# Altium footprint library Power_Lib_Altium.PcbLib: 383 footprints (part 21 of 24)
Each footprint in its own frame and in the unit in brackets; x right, y up, seen from the top. Pads: shape width x height; smd on the part's side, far side on the other; paste and mask are expansions set on the pad; w line width, h text height; cw(c..) or ccw(c..) is an arc to the next point about the centre after c.
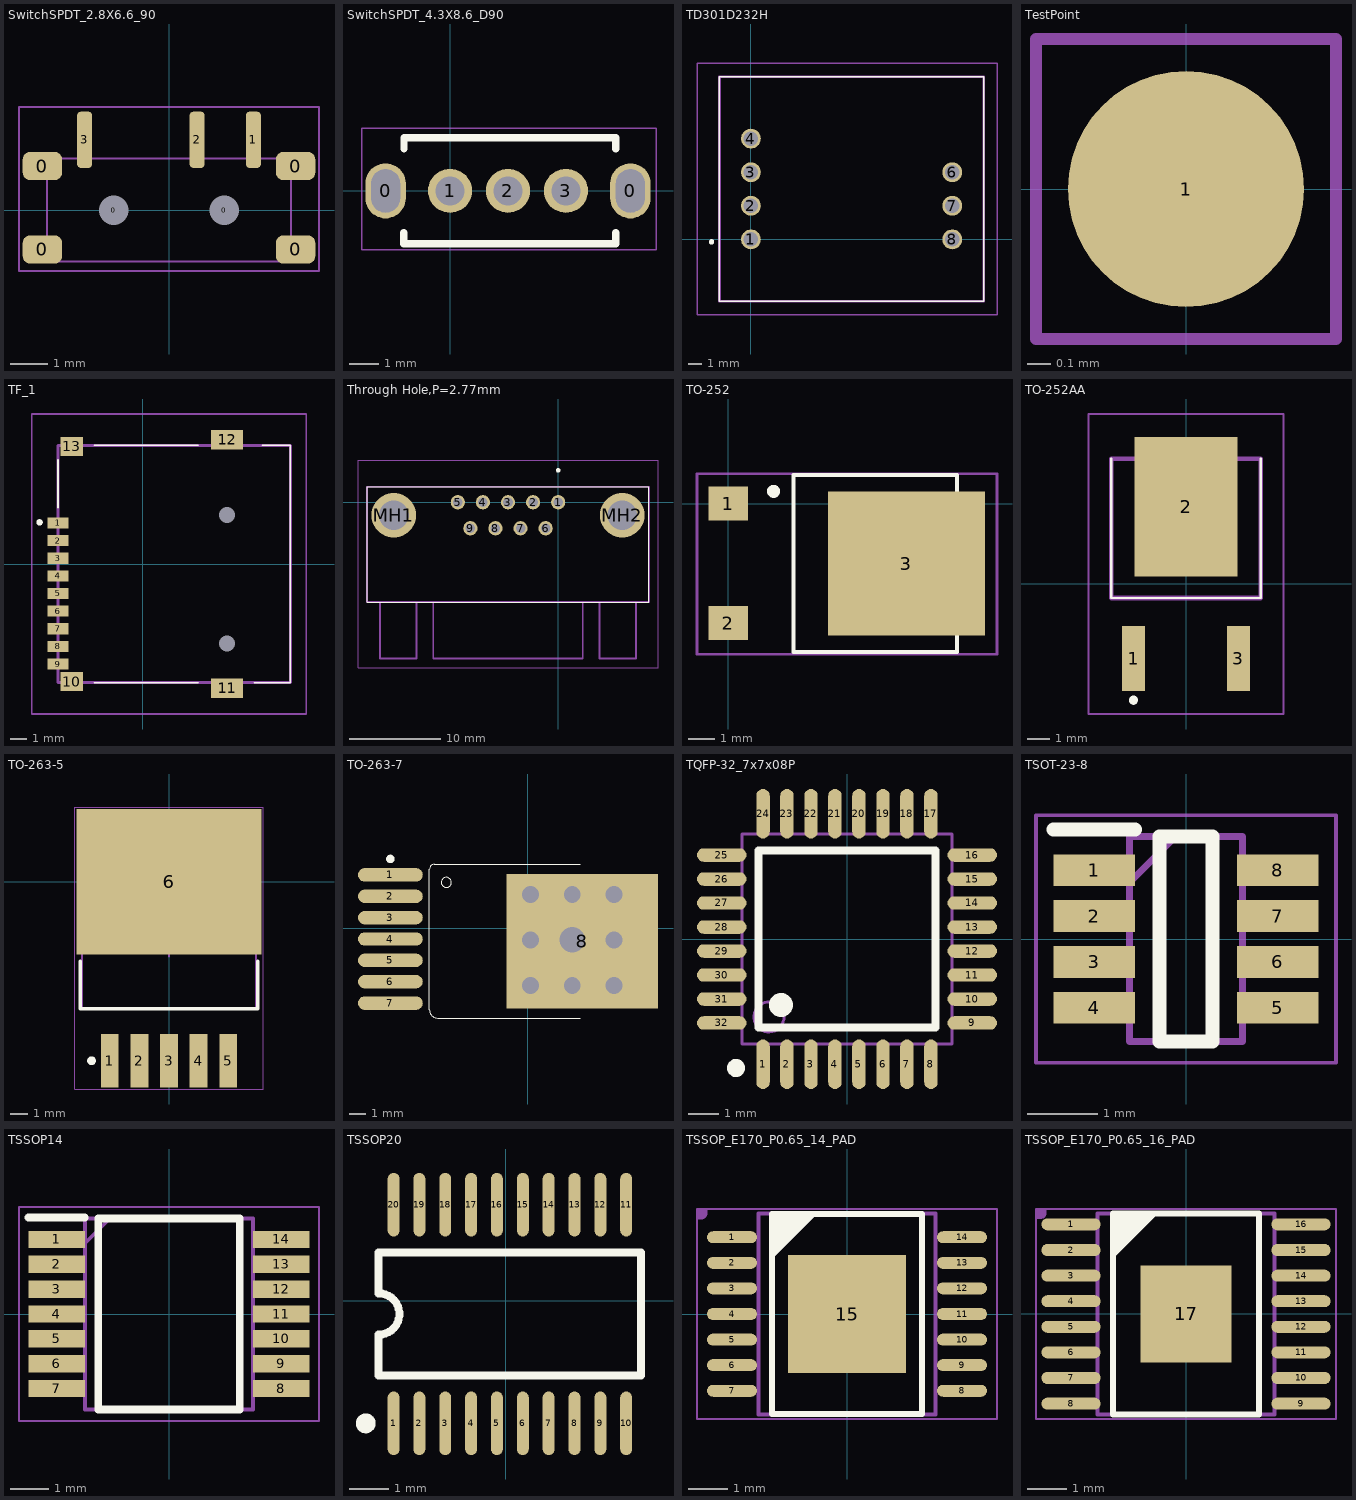
[diagram p20: the footprints below, top view; thin cyan lines are the x and y axes]

## SwitchSPDT_2.8X6.6_90 [mil]
pads (9):
  rrect50% 42x30 smd: 0(-135,-42) 0(-135,47) 0(135,-42) 0(135,47)
  round 10 hole 31.5: 0(-59.06,0) 0(59.06,0)
  rrect50% 16x60 smd: 1(90,75) 2(30,75) 3(-90,75)
Mechanical 13:
  lines w2: -130,-55 130,-55 130,55 -130,55 -130,-55
Mechanical 14:
  lines w2: -160,-65 160,-65 160,110 -160,110 -160,-65
3D body "User Library-MSS3_slide_switch_v2.STEP": height 55.12, standoff -19.68, extent -152.24,-110.67 150.91,86.18

## SwitchSPDT_4.3X8.6_D90 [mil]
pads (5):
  oval 55x75 hole 39.37 slot 59.06 at 90 deg: 0(-87.68,0) 0(245.16,0)
  round 60 hole 39.37: 1(0,0) 2(78.74,0) 3(157.48,0)
Top Overlay:
  lines w10: -62.83,-57 -62.83,-72 225,-72 225,-57 ; -62.68,57 -62.68,72 225.16,72 225.16,57
Mechanical 13:
  lines w2: -120,-80 -120,85 280,85 280,-80 -120,-80
Mechanical 14:
  lines w2: -120,-80 280,-80 280,85 -120,85 -120,-80
3D body "User Library-CK_Slide.STEP": height 190, standoff -105, extent -90.76,-245.62 248.24,84

## TD301D232H [mm]
pads (7):
  round 1.5 hole 1.1: 1(0,0) 2(0,2.54) 3(0,5.08) 4(0,7.62) 6(15.24,5.08) 7(15.24,2.54) 8(15.24,0)
Top Overlay:
  lines w0.1: -2.38,-4.69 -2.38,12.31 17.62,12.31 17.62,-4.69 -2.38,-4.69
  lines w0.2: -3.08,-0.19 ccw(c-2.98,-0.19) -2.88,-0.19 ccw(c-2.98,-0.19) -3.08,-0.19
Mechanical 13:
  lines w0.2: -2.38,-4.69 -2.38,12.31 17.62,12.31 17.62,-4.69 -2.38,-4.69
Mechanical 15:
  lines w0.1: -4.08,-5.69 -4.08,13.31 18.62,13.31 18.62,-5.69 -4.08,-5.69
3D body "TD301D232H.stp": height 7.6, standoff -5, extent -2.38,-4.69 17.62,12.31

## TestPoint [mm]
height 4.3
pads (1):
  round 1 smd: 1(0,0)
Mechanical 13:
  lines w0.051: -0.635,-0.635 -0.635,0.635 0.635,0.635 0.635,-0.635 -0.635,-0.635
Mechanical 14:
  lines w0.051: -0.635,-0.635 0.635,-0.635 0.635,0.635 -0.635,0.635 -0.635,-0.635

## TF_1 [mm]
pads (15):
  rect 1.3x0.7 smd: 1(-5.275,2.56) 2(-5.275,1.46) 3(-5.275,0.36) 4(-5.275,-0.74) 5(-5.275,-1.84) 6(-5.275,-2.94) 7(-5.275,-4.04) 8(-5.275,-5.14) 9(-5.275,-6.24)
  rect 1.4x1.2 smd: 10(-4.425,-7.34) 13(-4.425,7.34)
  rect 2x1.2 smd: 11(5.275,-7.76) 12(5.275,7.76)
  round 0.5 hole 1 unplated: 14(5.275,-4.95) 15(5.275,3.05)
Top Overlay:
  lines w0.1: -5.275,3.5 -5.275,6.5 ; -3.025,-7.4 3.475,-7.4 ; -3.025,7.4 3.475,7.4 ; 6.975,-7.4 9.225,-7.4 9.225,7.4 7.475,7.4
  lines w0.2: -6.525,2.6 ccw(c-6.425,2.6) -6.325,2.6 ccw(c-6.425,2.6) -6.525,2.6
Mechanical 13:
  lines w0.2: -5.275,-7.4 9.225,-7.4 9.225,7.4 -5.275,7.4 -5.275,-7.4
Mechanical 15:
  lines w0.1: -6.925,-9.36 10.225,-9.36 10.225,9.36 -6.925,9.36 -6.925,-9.36
3D body "TF-01A.stp": height 2.05, standoff -0.35, extent -5.9,-7.7 11.921,8.4

## Through Hole,P=2.77mm [mil]
pads (11):
  round 61.46 hole 40.98: 1(0,0) 2(-107.99,0) 3(-215.98,0) 4(-323.98,0) 5(-431.97,0) 6(-54.02,-111.97) 7(-162.01,-111.97) 8(-270,-111.97) 9(-377.99,-111.97)
  round 192.01 hole 128: MH1(-707.99,-55.98) MH2(276.02,-55.98)
Top Overlay:
  lines w3.94: -822.48,-429.96 -822.48,67.05 390.51,67.05 390.51,-429.96 -822.48,-429.96
  lines w11.81: 0,133.5 cw(c0,137.44) 0,141.38 cw(c0,137.44) 0,133.5
Mechanical 13:
  lines w7.87: -767.17,-429.96 -767.17,-672.8 -609.68,-672.8 -609.68,-429.96 ; -537.48,-429.96 -537.48,-672.8 105.51,-672.8 105.51,-429.96 ; 177.72,-429.96 177.72,-672.8 335.2,-672.8 335.2,-429.96 ; -822.48,-429.96 -822.48,67.05 390.51,67.05 390.51,-429.96 -822.48,-429.96
Mechanical 15:
  lines w3.94: -861.85,-712.17 -861.85,180.75 429.88,180.75 429.88,-712.17 -861.85,-712.17
3D body "5747844-5.stp": height 476.53, standoff -145.87, extent -826.14,-678.52 393.86,65.38

## TO-252 [mm] "贴片MOS管"
pads (3):
  rect 1.5x1.3 smd: 1(0,0) 2(0,-4.56)
  rect 6x5.5 smd: 3(6.8,-2.29)
Top Overlay:
  circle w0.25: c1.73,0.47 r0.125
  lines w0.154: 2.489,-5.664 8.738,-5.664 8.738,1.092 2.489,1.092 2.489,-5.664
Mechanical 14:
  lines w0.1: -1.195,-5.755 10.262,-5.755 10.262,1.145 -1.195,1.145 -1.195,-5.755
3D body "User Library-DPAK_TO-252AA.SLDPRT": height 2.37, standoff -0.03, extent -0.561,-5.653 9.539,1.081

## TO-252AA [mm]
pads (3):
  rect 1x2.85 smd: 1(-2.29,-3.278) 3(2.29,-3.278)
  rect 4.5x6.1 smd: 2(0,3.372)
Top Overlay:
  lines w0.1: -3.27,5.472 -3.27,-0.628 3.27,-0.628 3.27,5.472
  lines w0.2: -2.4,-5.1 ccw(c-2.3,-5.1) -2.2,-5.1 ccw(c-2.3,-5.1) -2.4,-5.1
Mechanical 13:
  lines w0.2: -3.27,-0.628 3.27,-0.628 3.27,5.472 -3.27,5.472 -3.27,-0.628
Mechanical 15:
  lines w0.1: -4.27,-5.703 4.27,-5.703 4.27,7.422 -4.27,7.422 -4.27,-5.703
3D body "User Library-DPAK_TO-252AA.SLDPRT": height 2.37, standoff -0.03, extent -3.367,-4.064 3.367,6.036

## TO-263-5 [mm]
pads (6):
  rect 1.016x3.05 smd: 1(-3.4,-10.305) 2(-1.7,-10.305) 3(0,-10.305) 4(1.7,-10.305) 5(3.4,-10.305)
  rect 10.66x8.38 smd: 6(0,0)
Top Overlay:
  circle w0.25: c-4.458,-10.305 r0.125
  lines w0.2: -5.118,-4.59 -5.118,-7.3 5.118,-7.3 5.118,-4.59
Mechanical 13:
  lines w0.1: -5.01,-7.3 -5.01,1.894 5.01,1.894 5.01,-7.3 -5.01,-7.3
Mechanical 15:
  lines w0.05: -5.43,-11.93 -5.43,4.29 5.43,4.29 5.43,-11.93 -5.43,-11.93
  lines w0.1: -0.5,-3.8 0.5,-3.8 ; 0,-4.3 0,-3.3
3D body "DPAK170P1420X457-6L.step": height 4.57, standoff 0, extent -5.01,-10.019 5.01,4.18

## TO-263-7 [mm]
pads (8):
  oval 3.85x0.8 smd: 1(-8.178,3.185) 2(-8.178,1.915) 3(-8.178,0.645) 4(-8.178,-0.625) 5(-8.178,-1.895) 6(-8.178,-3.165) 7(-8.178,-4.435)
  rect 9x8 smd: 8(3.235,-0.752)
via 0.145,-3.393 diameter 2 hole 1
via 2.634,2.017 diameter 2 hole 1
via 2.634,-3.393 diameter 2 hole 1
via 5.123,2.017 diameter 2 hole 1
via 5.123,-3.393 diameter 2 hole 1
via 5.123,-0.676 diameter 2 hole 1
via 2.634,-0.676 diameter 2 hole 1.5
via 0.145,-0.676 diameter 2 hole 1
via 0.145,2.017 diameter 2 hole 1
Top Overlay:
  circle w0.25: c-8.178,4.135 r0.125
  circle w0.025: c-4.853,2.74 r0.3
  lines w0.025: -5.147,-5.324 -5.37,-5.324 ; 3.115,-5.324 -5.37,-5.324 ; 3.115,3.816 -5.247,3.816 -5.568,3.816 ccw(c-5.568,3.532) -5.853,3.532 -5.853,3.134 -5.853,-4.841 ccw(c-5.37,-4.841) -5.37,-5.324
3D body "User Library-7L TO-263 THIN.SLDPRT": height 2, standoff -0.01, extent -8.255,-5.69 5.755,4.47

## TQFP-32_7x7x08P [mm]
pads (32):
  oval 0.45x1.65 smd: 1(-2.8,-4.175) 2(-2,-4.175) 3(-1.2,-4.175) 4(-0.4,-4.175) 5(0.4,-4.175) 6(1.2,-4.175) 7(2,-4.175) 8(2.8,-4.175) 17(2.8,4.175) 18(2,4.175) 19(1.2,4.175) 20(0.4,4.175) 21(-0.4,4.175) 22(-1.2,4.175) 23(-2,4.175) 24(-2.8,4.175)
  oval 1.65x0.45 smd: 9(4.175,-2.8) 10(4.175,-2) 11(4.175,-1.2) 12(4.175,-0.4) 13(4.175,0.4) 14(4.175,1.2) 15(4.175,2) 16(4.175,2.8) 25(-4.175,2.8) 26(-4.175,2) 27(-4.175,1.2) 28(-4.175,0.4) 29(-4.175,-0.4) 30(-4.175,-1.2) 31(-4.175,-2) 32(-4.175,-2.8)
Top Overlay:
  circle w0.4: c-2.2,-2.2 r0.2
  circle w0.3: c-3.7,-4.3 r0.15
  lines w0.254: -2.95,-2.95 2.95,-2.95 2.95,2.95 -2.95,2.95 -2.95,-2.95
Mechanical 13:
  circle w0.1: c-2.6,-2.6 r0.5
  lines w0.1: -3.5,-3.5 3.5,-3.5 3.5,3.5 -3.5,3.5 -3.5,-3.5
3D body "TQFP-9X9-32.STEP": height 1.6, standoff -0.05, extent -4.5,-4.5 4.5,4.5

## TSOT-23-8 [mm]
pads (8):
  rect 1.15x0.45 smd: 1(-1.3,0.975) 2(-1.3,0.325) 3(-1.3,-0.325) 4(-1.3,-0.975) 5(1.3,-0.975) 6(1.3,-0.325) 7(1.3,0.325) 8(1.3,0.975)
Top Overlay:
  lines w0.2: -1.875,1.55 -0.725,1.55 ; -0.375,-1.45 0.375,-1.45 0.375,1.45 -0.375,1.45 -0.375,-1.45
Mechanical 13:
  lines w0.1: -0.8,0.8 -0.15,1.45 ; -0.8,-1.45 0.8,-1.45 0.8,1.45 -0.8,1.45 -0.8,-1.45
Mechanical 15:
  lines w0.05: -2.125,-1.75 2.125,-1.75 2.125,1.75 -2.125,1.75 -2.125,-1.75
3D body "MP2225GJ-P.stp": height 1, standoff 0, extent -1.4,-1.45 1.4,1.45

## TSSOP14 [mm]
pads (14):
  rect 1.475x0.45 smd: 1(-2.938,1.95) 2(-2.938,1.3) 3(-2.938,0.65) 4(-2.938,0) 5(-2.938,-0.65) 6(-2.938,-1.3) 7(-2.938,-1.95) 8(2.938,-1.95) 9(2.938,-1.3) 10(2.938,-0.65) 11(2.938,0) 12(2.938,0.65) 13(2.938,1.3) 14(2.938,1.95)
Top Overlay:
  lines w0.2: -3.675,2.525 -2.2,2.525 ; -1.85,-2.5 1.85,-2.5 1.85,2.5 -1.85,2.5 -1.85,-2.5
Mechanical 13:
  lines w0.1: -2.2,1.85 -1.55,2.5 ; -2.2,-2.5 2.2,-2.5 2.2,2.5 -2.2,2.5 -2.2,-2.5
Mechanical 15:
  lines w0.05: -3.925,-2.8 3.925,-2.8 3.925,2.8 -3.925,2.8 -3.925,-2.8
3D body "SN74HCT08PW.stp": height 1.2, standoff 0, extent -3.2,-2.5 3.2,2.5

## TSSOP20 [mm]
pads (20):
  oval 0.3x1.6 smd: 1(-2.823,-3.08) 2(-2.173,-3.08) 3(-1.523,-3.08) 4(-0.873,-3.08) 5(-0.223,-3.08) 6(0.427,-3.08) 7(1.077,-3.08) 8(1.727,-3.08) 9(2.377,-3.08) 10(3.027,-3.08) 11(3.027,2.42) 12(2.377,2.42) 13(1.727,2.42) 14(1.077,2.42) 15(0.427,2.42) 16(-0.223,2.42) 17(-0.873,2.42) 18(-1.523,2.42) 19(-2.173,2.42) 20(-2.823,2.42)
Top Overlay:
  circle w0.25: c-3.523,-3.08 r0.125
  lines w0.2: -3.198,-1.88 3.402,-1.88 3.402,1.22 -3.198,1.22 -3.198,0.19 cw(c-3.198,-0.33) -3.198,-0.85 -3.198,-1.88
3D body "User Library-tssop-20-1.SLDPRT": height 1.2, standoff 0, extent -3.198,-3.706 3.402,2.894

## TSSOP_E170_P0.65_14_PAD [mil]
height 47.24
pads (15):
  oval 50x12 smd: 1(-115,76.77) 2(-115,51.18) 3(-115,25.59) 4(-115,0) 5(-115,-25.59) 6(-115,-51.18) 7(-115,-76.77) 8(115,-76.77) 9(115,-51.18) 10(115,-25.59) 11(115,0) 12(115,25.59) 13(115,51.18) 14(115,76.77)
  rect 118.11x118.11 smd: 15(0,0)
Top Overlay:
  region: -75,100.47 -30,100.47 -75,55.47
  lines w6: -75,-100 -75,100 75,100 75,-100 -75,-100
Mechanical 13:
  lines w2: -10,0 10,0 ; 0,-10 0,10
  lines w3.94: -88.58,-100.39 -88.58,100.39 88.58,100.39 88.58,-100.39 -88.58,-100.39
Mechanical 14:
  region: -150,105 -140,105 -140,100 -140,99.01 -140.76,97.17 -142.17,95.76 -144.01,95 -145,95 -150,95
  lines w2: -150,-105 150,-105 150,105 -150,105 -150,-105
3D body "User Library-tssop14-2.STEP": height 47.24, standoff 0, extent -125.98,-100.39 125.99,100.4

## TSSOP_E170_P0.65_16_PAD [mm]
height 1.2
pads (17):
  oval 1.5x0.305 smd: 1(-2.921,2.275) 2(-2.921,1.625) 3(-2.921,0.975) 4(-2.921,0.325) 5(-2.921,-0.325) 6(-2.921,-0.975) 7(-2.921,-1.625) 8(-2.921,-2.275) 9(2.921,-2.275) 10(2.921,-1.625) 11(2.921,-0.975) 12(2.921,-0.325) 13(2.921,0.325) 14(2.921,0.975) 15(2.921,1.625) 16(2.921,2.275)
  rect 2.31x2.46 smd: 17(0,0)
Top Overlay:
  region: -1.85,2.562 -0.707,2.562 -1.85,1.419
  lines w0.152: -1.85,-2.55 1.85,-2.55 1.85,2.55 -1.85,2.55 -1.85,-2.55
Mechanical 13:
  lines w0.051: -0.254,0 0.254,0 ; 0,-0.254 0,0.254
  lines w0.1: -2.25,-2.55 2.25,-2.55 2.25,2.55 -2.25,2.55 -2.25,-2.55
Mechanical 14:
  region: -3.81,2.667 -3.556,2.667 -3.556,2.54 -3.556,2.515 -3.575,2.468 -3.611,2.432 -3.658,2.413 -3.683,2.413 -3.81,2.413
  lines w0.051: -3.81,-2.667 3.81,-2.667 3.81,2.667 -3.81,2.667 -3.81,-2.667
3D body "User Library-tssop16-2.STEP": height 1.2, standoff 0, extent -3.2,-2.55 3.2,2.55